# Altium schematic symbol library IC_TI.SCHLIB: 1162 symbols (part 2 of 8) (continued)
## LM337 (continued)
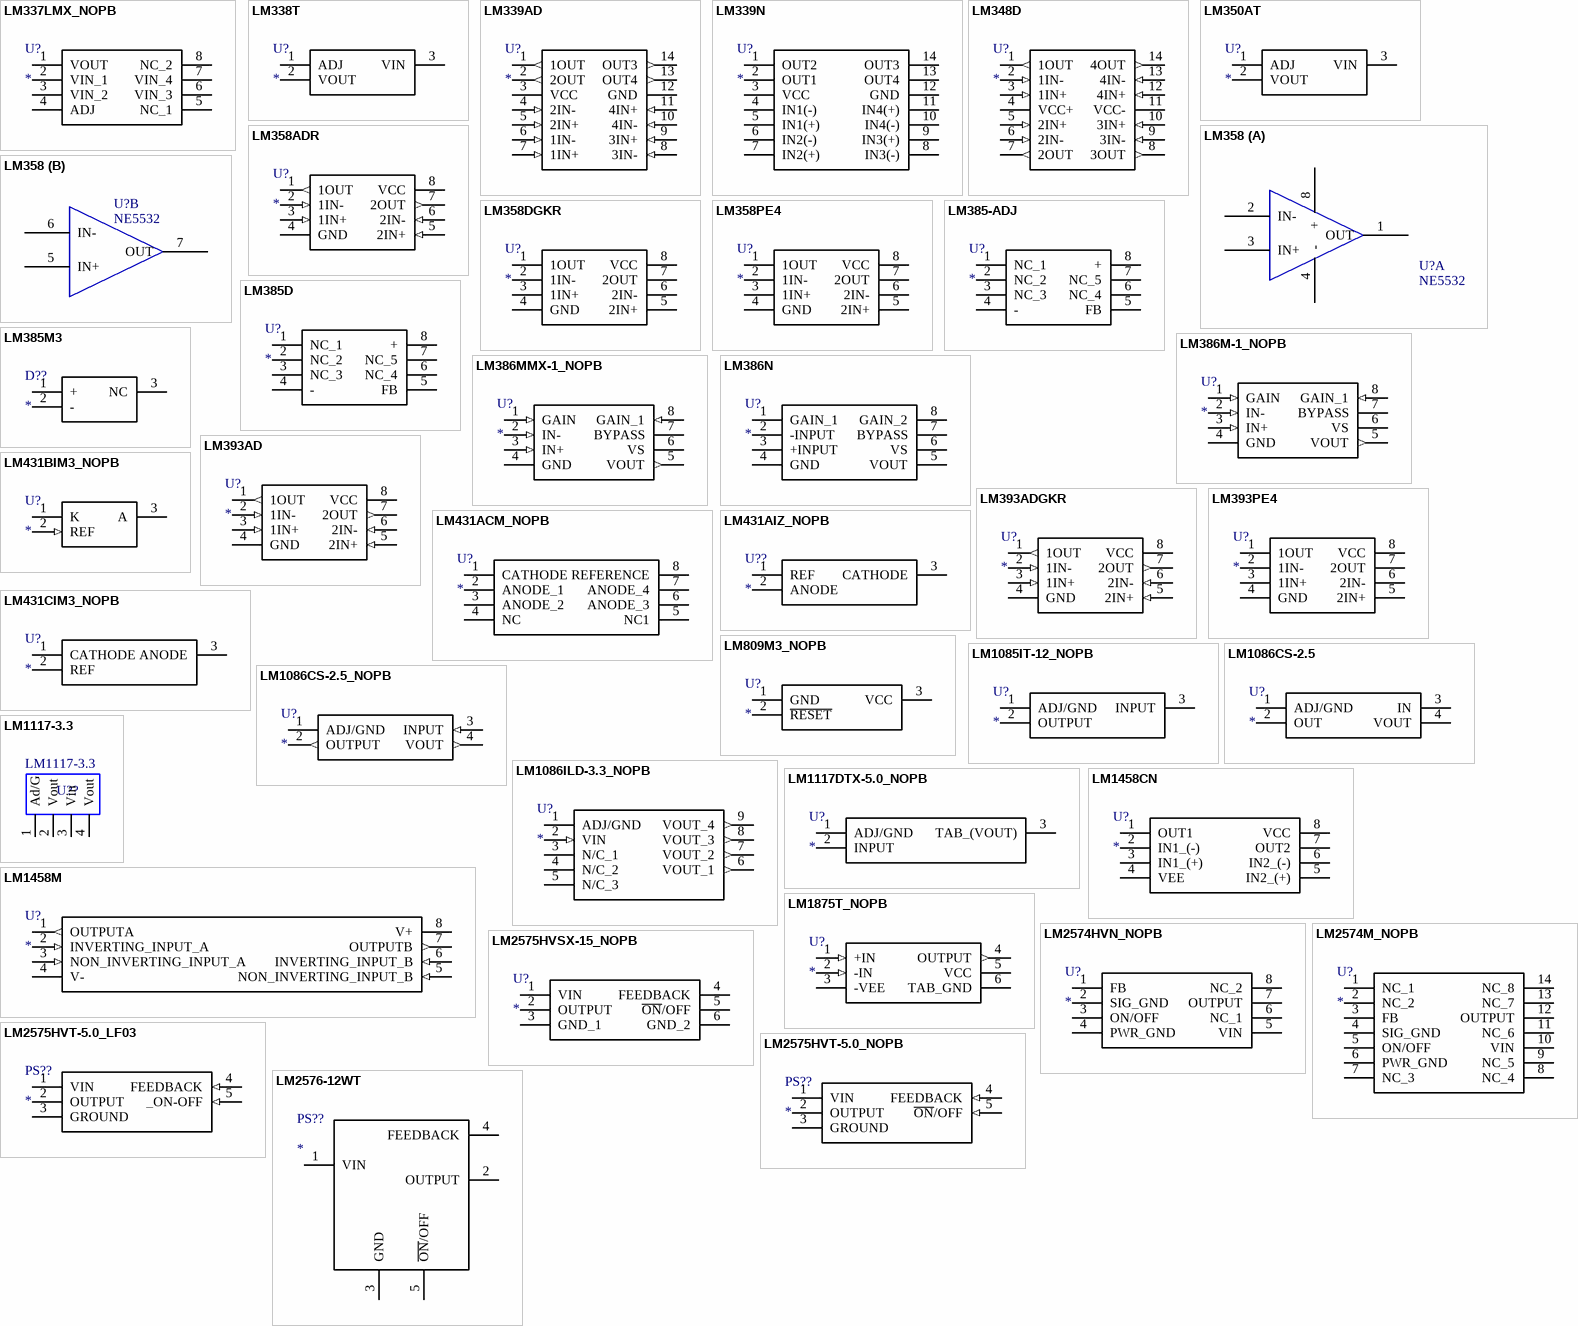
[diagram p8: symbols LM337LMX_NOPB to LM2576-12WT]

## LM337LMX_NOPB
designator U?
Integrated Circuit; Manufacturer_Name: Texas Instruments; Manufacturer_Part_Number: LM337LMX/NOPB; Datasheet Link: http://www.ti.com/lit/gpn/lm337l; Height: 1.75mm; Mouser Part Number: 926-LM337LMX/NOPB; Mouser Price/Stock: https://www.mouser.com/Search/Refine.aspx?Keyword=926-LM337LMX%2FNOPB
footprint SOIC8_1.27 (SOP, 8-Leads, Pitch 1.27mm)
pins: 1 VOUT, 2 VIN_1, 3 VIN_2, 4 ADJ, 5 NC_1, 6 VIN_3, 7 VIN_4, 8 NC_2

## LM338T
designator U?
Integrated Circuit; Manufacturer_Name: Texas Instruments; Manufacturer_Part_Number: LM338T; Datasheet Link: http://www.ti.com/lit/ds/symlink/lm338.pdf; Height: 4.7mm; Mouser Part Number: 926-LM338T; Mouser Price/Stock: https://www.mouser.com/Search/Refine.aspx?Keyword=926-LM338T; RS Part Number: 2508260761; RS Price/Stock: http://uk.rs-online.com/web/p/products/2508260761
footprint TO220-3
pins: 1 ADJ, 2 VOUT, 3 VIN

## LM339AD
designator U?
Integrated Circuit; Manufacturer_Name: Texas Instruments; Manufacturer_Part_Number: LM339AD; Datasheet Link: http://www.ti.com/lit/ds/symlink/lm339a.pdf; Height: 1.75mm; Mouser Part Number: 595-LM339AD; Mouser Price/Stock: https://www.mouser.com/Search/Refine.aspx?Keyword=595-LM339AD; RS Part Number: 1449913; RS Price/Stock: http://uk.rs-online.com/web/p/products/1449913
footprint SOIC14_1.27
pins: 1 1OUT (out), 2 2OUT (out), 3 VCC (power), 4 2IN- (in), 5 2IN+ (in), 6 1IN- (in), 7 1IN+ (in), 8 3IN- (in), 9 3IN+ (in), 10 4IN- (in), 11 4IN+ (in), 12 GND (power), 13 OUT4 (out), 14 OUT3 (out)

## LM339N
designator U?
Integrated Circuit; Manufacturer_Name: Fairchild Semiconductor; Manufacturer_Part_Number: LM339N; Datasheet Link: https://www.fairchildsemi.com/datasheets/LM/LM239A.pdf; Height: 3.65mm; Mouser Part Number: 512-LM339N; Mouser Price/Stock: https://www.mouser.com/Search/Refine.aspx?Keyword=512-LM339N; RS Part Number: 2679872; RS Price/Stock: http://uk.rs-online.com/web/p/products/2679872
footprint DIP14
pins: 1 OUT2, 2 OUT1, 3 VCC, 4 IN1(-), 5 IN1(+), 6 IN2(-), 7 IN2(+), 8 IN3(-), 9 IN3(+), 10 IN4(-), 11 IN4(+), 12 GND, 13 OUT4, 14 OUT3

## LM348D
designator U?
Integrated Circuit; Manufacturer_Name: Texas Instruments; Manufacturer_Part_Number: LM348D; Datasheet Link: http://www.ti.com/lit/ds/symlink/lm348.pdf; Height: 1.75mm; Mouser Part Number: 595-LM348D; Mouser Price/Stock: https://www.mouser.com/Search/Refine.aspx?Keyword=595-LM348D; RS Part Number: 5172251; RS Price/Stock: http://uk.rs-online.com/web/p/products/5172251
footprint SOIC14_1.27
pins: 1 1OUT (out), 2 1IN- (in), 3 1IN+ (in), 4 VCC+ (power), 5 2IN+ (in), 6 2IN- (in), 7 2OUT (out), 8 3OUT (out), 9 3IN- (in), 10 3IN+ (in), 11 VCC- (power), 12 4IN+ (in), 13 4IN- (in), 14 4OUT (out)

## LM350AT
designator U?
Integrated Circuit; Manufacturer_Name: Texas Instruments; Manufacturer_Part_Number: LM350AT; Datasheet Link: https://www.jameco.com/Jameco/Products/ProdDS/838946.pdf; Height: 4.7mm; Mouser Part Number: 926-LM350AT; Mouser Price/Stock: https://www.mouser.com/Search/Refine.aspx?Keyword=926-LM350AT; RS Part Number: 4713974; RS Price/Stock: http://uk.rs-online.com/web/p/products/4713974
footprint TO220-3
pins: 1 ADJ, 2 VOUT, 3 VIN

## LM358
designator U?, comment NE5532
footprint SOIC8_1.27 (SOP, 8-Leads, Pitch 1.27mm)
part A pins: 1 OUT, 2 IN-, 3 IN+, 4 -, 8 +
part B pins: 5 IN+, 6 IN-, 7 OUT

## LM358ADR
designator U?
Integrated Circuit; Manufacturer_Name: Texas Instruments; Manufacturer_Part_Number: LM358ADR; Datasheet Link: http://www.ti.com/lit/ds/symlink/lm358a.pdf; Height: 1.75mm; Mouser Part Number: 595-LM358ADR; Mouser Price/Stock: https://www.mouser.com/Search/Refine.aspx?Keyword=595-LM358ADR; RS Part Number: 1788886; RS Price/Stock: http://uk.rs-online.com/web/p/products/1788886
footprint SOIC8_1.27 (SOP, 8-Leads, Pitch 1.27mm)
pins: 1 1OUT (out), 2 1IN- (in), 3 1IN+ (in), 4 GND (power), 5 2IN+ (in), 6 2IN- (in), 7 2OUT (out), 8 VCC (power)

## LM358DGKR
designator U?
Integrated Circuit; Manufacturer_Name: Texas Instruments; Manufacturer_Part_Number: LM358DGKR; Datasheet Link: http://www.ti.com/lit/gpn/lm358; Height: 1.1mm; Mouser Part Number: 595-LM358DGKR; Mouser Price/Stock: https://www.mouser.com/Search/Refine.aspx?Keyword=595-LM358DGKR; RS Part Number: 1625387; RS Price/Stock: http://uk.rs-online.com/web/p/products/1625387
footprint VSSOP8_0.65-PAD
pins: 1 1OUT, 2 1IN-, 3 1IN+, 4 GND, 5 2IN+, 6 2IN-, 7 2OUT, 8 VCC

## LM358PE4
designator U?
Integrated Circuit; Manufacturer_Name: Texas Instruments; Manufacturer_Part_Number: LM358PE4; Datasheet Link: http://www.ti.com/lit/ds/symlink/lm358.pdf; Height: 5.08mm; Mouser Part Number: 595-LM358PE4; Mouser Price/Stock: https://www.mouser.com/Search/Refine.aspx?Keyword=595-LM358PE4
footprint DIP8-A
pins: 1 1OUT, 2 1IN-, 3 1IN+, 4 GND, 5 2IN+, 6 2IN-, 7 2OUT, 8 VCC

## LM385-ADJ
designator U?
Integrated Circuit; Manufacturer_Name: Texas Instruments; Manufacturer_Part_Number: LM385-ADJ; Datasheet Link: http://www.ti.com/lit/ds/symlink/lm385-adj.pdf; Height: 1.75mm
footprint SOIC8_1.27 (SOP, 8-Leads, Pitch 1.27mm)
pins: 1 NC_1, 2 NC_2, 3 NC_3, 4 -, 5 FB, 6 NC_4, 7 NC_5, 8 +

## LM385D
designator U?
Integrated Circuit; Manufacturer_Name: Texas Instruments; Manufacturer_Part_Number: LM385-ADJ; Datasheet Link: http://www.ti.com/lit/ds/symlink/lm385-adj.pdf; Height: 1.75mm
footprint SOIC8_1.27 (SOP, 8-Leads, Pitch 1.27mm)
pins: 1 NC_1, 2 NC_2, 3 NC_3, 4 -, 5 FB, 6 NC_4, 7 NC_5, 8 +

## LM385M3
designator D??
Diode; Manufacturer_Name: Texas Instruments; Manufacturer_Part_Number: LM385M3-1.2; Datasheet Link: http://www.ti.com/lit/ds/symlink/lm385-1.2-n.pdf; Height: 0.95mm; Mouser Part Number: 926-LM385M3-12; Mouser Price/Stock: https://www.mouser.com/Search/Refine.aspx?Keyword=926-LM385M3-12; RS Part Number: 2508261562; RS Price/Stock: http://uk.rs-online.com/web/p/products/2508261562
footprint SOT23-3 (贴片MOS的SOT-23封装)
pins: 1 +, 2 -, 3 NC

## LM386M-1_NOPB
designator U?
Integrated Circuit; Manufacturer_Name: Texas Instruments; Manufacturer_Part_Number: LM386M-1/NOPB; Datasheet Link: http://docs-emea.rs-online.com/webdocs/06e8/0900766b806e88be.pdf; Height: 1.753mm; Mouser Part Number: 926-LM386M-1/NOPB; Mouser Price/Stock: https://www.mouser.com/Search/Refine.aspx?Keyword=926-LM386M-1%2FNOPB; RS Part Number: 5361366P; RS Price/Stock: http://uk.rs-online.com/web/p/products/5361366P
footprint SOIC8_1.27 (SOP, 8-Leads, Pitch 1.27mm)
pins: 1 GAIN (in), 2 IN- (in), 3 IN+ (in), 4 GND (power), 5 VOUT (out), 6 VS, 7 BYPASS, 8 GAIN_1 (in)

## LM386MMX-1_NOPB
designator U?
Integrated Circuit; Manufacturer_Name: Texas Instruments; Manufacturer_Part_Number: LM386MMX-1/NOPB; Datasheet Link: http://www.ti.com/lit/gpn/lm386; Height: 1.1mm; Mouser Part Number: 926-LM386MMX-1/NOPB; Mouser Price/Stock: https://www.mouser.com/Search/Refine.aspx?Keyword=926-LM386MMX-1%2FNOPB
footprint VSSOP8_0.65-PAD
pins: 1 GAIN (in), 2 IN- (in), 3 IN+ (in), 4 GND (power), 5 VOUT (out), 6 VS, 7 BYPASS, 8 GAIN_1 (in)

## LM386N
designator U?
Integrated Circuit; Manufacturer_Name: Texas Instruments; Manufacturer_Part_Number: LM386N; Datasheet Link: http://www.ti.com/lit/ds/symlink/lm386.pdf; Height: 5.08mm; Mouser Part Number: 595-LM386N; Mouser Price/Stock: https://www.mouser.com/Search/Refine.aspx?Keyword=595-LM386N
footprint DIP8-A
pins: 1 GAIN_1, 2 -INPUT, 3 +INPUT, 4 GND, 5 VOUT, 6 VS, 7 BYPASS, 8 GAIN_2

## LM393AD
designator U?
Integrated Circuit; Manufacturer_Name: Texas Instruments; Manufacturer_Part_Number: LM393AD; Datasheet Link: http://www.ti.com/lit/ds/symlink/lm393a.pdf; Height: 1.75mm; Mouser Part Number: 595-LM393AD; Mouser Price/Stock: https://www.mouser.com/Search/Refine.aspx?Keyword=595-LM393AD; RS Part Number: 1791746; RS Price/Stock: http://uk.rs-online.com/web/p/products/1791746
footprint SOIC8_1.27 (SOP, 8-Leads, Pitch 1.27mm)
pins: 1 1OUT (out), 2 1IN- (in), 3 1IN+ (in), 4 GND (power), 5 2IN+ (in), 6 2IN- (in), 7 2OUT (out), 8 VCC (power)

## LM393ADGKR
designator U?
Integrated Circuit; Manufacturer_Name: Texas Instruments; Manufacturer_Part_Number: LM393ADGKR; Datasheet Link: http://www.ti.com/lit/ds/symlink/lm393a.pdf; Height: 1.1mm; Mouser Part Number: 595-LM393ADGKR; Mouser Price/Stock: https://www.mouser.com/Search/Refine.aspx?Keyword=595-LM393ADGKR; RS Part Number: 1626568; RS Price/Stock: http://uk.rs-online.com/web/p/products/1626568
footprint VSSOP8_0.65-PAD
pins: 1 1OUT (out), 2 1IN- (in), 3 1IN+ (in), 4 GND (power), 5 2IN+ (in), 6 2IN- (in), 7 2OUT (out), 8 VCC (power)

## LM393PE4
designator U?
Integrated Circuit; Manufacturer_Name: Texas Instruments; Manufacturer_Part_Number: LM393PE4; Datasheet Link: http://www.ti.com/lit/ds/symlink/lm393.pdf; Height: 5.08mm; Mouser Part Number: 595-LM393PE4; Mouser Price/Stock: https://www.mouser.com/Search/Refine.aspx?Keyword=595-LM393PE4
footprint DIP8-A
pins: 1 1OUT, 2 1IN-, 3 1IN+, 4 GND, 5 2IN+, 6 2IN-, 7 2OUT, 8 VCC

## LM431ACM_NOPB
designator U?
Integrated Circuit; Manufacturer_Name: Texas Instruments; Manufacturer_Part_Number: LM431ACM/NOPB; Datasheet Link: http://www.ti.com/lit/ds/symlink/lm431.pdf; Height: 1.75mm; Mouser Part Number: 926-LM431ACM/NOPB; Mouser Price/Stock: https://www.mouser.com/Search/Refine.aspx?Keyword=926-LM431ACM%2FNOPB; RS Part Number: 1788847; RS Price/Stock: http://uk.rs-online.com/web/p/products/1788847
footprint SOIC8_1.27 (SOP, 8-Leads, Pitch 1.27mm)
pins: 1 CATHODE, 2 ANODE_1, 3 ANODE_2, 4 NC, 5 NC1, 6 ANODE_3, 7 ANODE_4, 8 REFERENCE

## LM431AIZ_NOPB
designator U??
Undefined or Miscellaneous; Manufacturer_Name: Texas Instruments; Manufacturer_Part_Number: LM431AIZ/NOPB; Datasheet Link: http://www.ti.com/lit/gpn/lm431; Mouser Part Number: 926-LM431AIZ/NOPB; Mouser Price/Stock: https://www.mouser.com/Search/Refine.aspx?Keyword=926-LM431AIZ%2FNOPB; RS Part Number: 1626257; RS Price/Stock: http://uk.rs-online.com/web/p/products/1626257
footprint TO92
pins: 1 REF, 2 ANODE, 3 CATHODE

## LM431BIM3_NOPB
designator U?
Integrated Circuit; Manufacturer_Name: Texas Instruments; Manufacturer_Part_Number: LM431BIM3/NOPB; Datasheet Link: http://www.ti.com/lit/ds/symlink/lm431.pdf; Height: 1.12mm; Mouser Part Number: 926-LM431BIM3/NOPB; Mouser Price/Stock: https://www.mouser.com/Search/Refine.aspx?Keyword=926-LM431BIM3%2FNOPB; RS Part Number: 5359751P; RS Price/Stock: http://befr.rs-online.com/web/p/products/5359751P
footprint SOT23-3 (贴片MOS的SOT-23封装)
pins: 1 K, 2 REF (in), 3 A

## LM431CIM3_NOPB
designator U?
Integrated Circuit; Manufacturer_Name: Texas Instruments; Manufacturer_Part_Number: LM431CIM3/NOPB; Datasheet Link: http://www.farnell.com/datasheets/1972837.pdf; Height: 1.12mm; Mouser Part Number: 926-LM431CIM3/NOPB; Mouser Price/Stock: https://www.mouser.com/Search/Refine.aspx?Keyword=926-LM431CIM3%2FNOPB; RS Part Number: 7615949P; RS Price/Stock: http://uk.rs-online.com/web/p/products/7615949P
footprint SOT23-3 (贴片MOS的SOT-23封装)
pins: 1 CATHODE, 2 REF, 3 ANODE

## LM809M3_NOPB
designator U?
Integrated Circuit; Manufacturer_Name: Texas Instruments; Manufacturer_Part_Number: LM809M3-4.38/NOPB; Datasheet Link: http://www.ti.com/lit/gpn/lm809; Height: 0.95mm; Mouser Part Number: 595-LM809M3-4.3/NPB; Mouser Price/Stock: https://www.mouser.com/Search/Refine.aspx?Keyword=595-LM809M3-4.3%2FNPB
footprint SOT23-3 (贴片MOS的SOT-23封装)
pins: 1 GND, 2 ~{RESET}, 3 VCC

## LM1085IT-12_NOPB
designator U?
Integrated Circuit; Manufacturer_Name: Texas Instruments; Manufacturer_Part_Number: LM1085IT-12/NOPB; Datasheet Link: http://www.ti.com/lit/gpn/lm1085; Height: 4.7mm; Mouser Part Number: 926-LM1085IT-12/NOPB; Mouser Price/Stock: https://www.mouser.com/Search/Refine.aspx?Keyword=926-LM1085IT-12%2FNOPB; RS Part Number: 5339381P; RS Price/Stock: http://uk.rs-online.com/web/p/products/5339381P
footprint TO220-3
pins: 1 ADJ/GND, 2 OUTPUT, 3 INPUT

## LM1086CS-2.5
designator U?
Integrated Circuit; Manufacturer_Name: Texas Instruments; Manufacturer_Part_Number: LM1086CS-2.5; RS Part Number: 4717471; RS Price/Stock: http://uk.rs-online.com/web/p/products/4717471
footprint TO263-3
pins: 1 ADJ/GND, 2 OUT, 3 IN, 4 VOUT

## LM1086CS-2.5_NOPB
designator U?
Integrated Circuit; Manufacturer_Name: Texas Instruments; Manufacturer_Part_Number: LM1086CS-2.5/NOPB; Datasheet Link: http://www.ti.com/lit/ds/symlink/lm1086.pdf; Height: 4.64mm; Mouser Part Number: 926-LM1086CS25NOPB; Mouser Price/Stock: https://www.mouser.com/Search/Refine.aspx?Keyword=926-LM1086CS25NOPB; RS Part Number: 1789246; RS Price/Stock: http://uk.rs-online.com/web/p/products/1789246
footprint TO263-3
pins: 1 ADJ/GND (power), 2 OUTPUT (out), 3 INPUT (in), 4 VOUT (out)

## LM1086ILD-3.3_NOPB
designator U?
Integrated Circuit; Manufacturer_Name: Texas Instruments; Manufacturer_Part_Number: LM1086ILD-3.3/NOPB; Datasheet Link: http://www.ti.com/lit/ds/symlink/lm1086.pdf; Height: 0.8mm; Mouser Part Number: 926-LM1086ILD33NOPB; Mouser Price/Stock: https://www.mouser.com/Search/Refine.aspx?Keyword=926-LM1086ILD33NOPB
footprint DFN8_0.8-PAD(4X4) (DFN8_0.5-PAD(3X3))
pins: 1 ADJ/GND (power), 2 VIN (in), 3 N/C_1, 4 N/C_2, 5 N/C_3, 6 VOUT_1 (out), 7 VOUT_2 (out), 8 VOUT_3 (out), 9 VOUT_4 (out)

## LM1117-3.3
designator U??, comment Sch Name: LM1117-3.3  (hidden comment: Device Name)
3.3V稳压芯片1117; Manufacture: Device Name
footprint SOT223
pins: 1 Ad/G, 2 Vout, 3 Vin, 4 Vout

## LM1117DTX-5.0_NOPB
designator U?
Integrated Circuit; Manufacturer_Name: Texas Instruments; Manufacturer_Part_Number: LM1117DTX-5.0/NOPB; Datasheet Link: http://www.ti.com/lit/gpn/lm1117; Mouser Part Number: 926-LM1117DTX50NOPB; Mouser Price/Stock: https://www.mouser.com/Search/Refine.aspx?Keyword=926-LM1117DTX50NOPB
footprint TO252
pins: 1 ADJ/GND, 2 INPUT, 3 TAB_(VOUT)

## LM1458CN
designator U?
Integrated Circuit; Manufacturer_Name: Fairchild Semiconductor; Manufacturer_Part_Number: LM1458CN; Datasheet Link: https://componentsearchengine.com/Datasheets/1/LM1458CN.pdf; Height: 5.08mm; Mouser Part Number: 512-LM1458CN; Mouser Price/Stock: https://www.mouser.com/Search/Refine.aspx?Keyword=512-LM1458CN
footprint DIP8
pins: 1 OUT1, 2 IN1_(-), 3 IN1_(+), 4 VEE, 5 IN2_(+), 6 IN2_(-), 7 OUT2, 8 VCC

## LM1458M
designator U?
Integrated Circuit; Manufacturer_Name: Texas Instruments; Manufacturer_Part_Number: LM1458M; Datasheet Link: http://www.ti.com/lit/ds/symlink/lm1458.pdf; Height: 1.75mm; Mouser Part Number: 926-LM1458M; Mouser Price/Stock: https://www.mouser.com/Search/Refine.aspx?Keyword=926-LM1458M; RS Part Number: 4716175; RS Price/Stock: http://uk.rs-online.com/web/p/products/4716175
footprint SOIC8_1.27 (SOP, 8-Leads, Pitch 1.27mm)
pins: 1 OUTPUTA (out), 2 INVERTING_INPUT_A (in), 3 NON_INVERTING_INPUT_A (in), 4 V-, 5 NON_INVERTING_INPUT_B (in), 6 INVERTING_INPUT_B (in), 7 OUTPUTB (out), 8 V+

## LM1875T_NOPB
designator U?
Integrated Circuit; Manufacturer_Name: Texas Instruments; Manufacturer_Part_Number: LM1875T/NOPB; Datasheet Link: http://www.ti.com/lit/ds/symlink/lm1875.pdf; Mouser Part Number: 926-LM1875T/NOPB; Mouser Price/Stock: https://www.mouser.com/Search/Refine.aspx?Keyword=926-LM1875T%2FNOPB; RS Part Number: 5358736P; RS Price/Stock: http://uk.rs-online.com/web/p/products/5358736P
footprint TO220-5
pins: 1 +IN (in), 2 -IN (in), 3 -VEE, 4 OUTPUT (out), 5 VCC (power), 6 TAB_GND (power)

## LM2574HVN_NOPB
designator U?
Integrated Circuit; Manufacturer_Name: Texas Instruments; Manufacturer_Part_Number: LM2574HVN-12/NOPB; Datasheet Link: http://www.ti.com/lit/gpn/lm2574hv; Height: 5.08mm; Mouser Part Number: 926-LM2574HVN12NOPB; Mouser Price/Stock: https://www.mouser.com/Search/Refine.aspx?Keyword=926-LM2574HVN12NOPB; RS Part Number: 1626563; RS Price/Stock: http://uk.rs-online.com/web/p/products/1626563
footprint DIP8-A
pins: 1 FB, 2 SIG_GND, 3 ON/OFF, 4 PWR_GND, 5 VIN, 6 NC_1, 7 OUTPUT, 8 NC_2

## LM2574M_NOPB
designator U?
Integrated Circuit; Manufacturer_Name: Texas Instruments; Manufacturer_Part_Number: LM2574M-3.3/NOPB; Datasheet Link: http://www.ti.com/lit/gpn/lm2574; Height: 2.642mm; Mouser Part Number: 926-LM2574M-3.3/NOPB; Mouser Price/Stock: https://www.mouser.com/Search/Refine.aspx?Keyword=926-LM2574M-3.3%2FNOPB; RS Part Number: 7615491P; RS Price/Stock: http://uk.rs-online.com/web/p/products/7615491P
footprint SOIC14W_1.27
pins: 1 NC_1, 2 NC_2, 3 FB, 4 SIG_GND, 5 ON/OFF, 6 PWR_GND, 7 NC_3, 8 NC_4, 9 NC_5, 10 VIN, 11 NC_6, 12 OUTPUT, 13 NC_7, 14 NC_8

## LM2575HVSX-15_NOPB
designator U?
Integrated Circuit; Manufacturer_Name: Texas Instruments; Manufacturer_Part_Number: LM2575HVSX-15/NOPB; Datasheet Link: http://www.ti.com/lit/ds/symlink/lm2575-n.pdf; Mouser Part Number: 926-LM2575HVSX15NOPB; Mouser Price/Stock: https://www.mouser.com/Search/Refine.aspx?Keyword=926-LM2575HVSX15NOPB
footprint TO263-5
pins: 1 VIN, 2 OUTPUT, 3 GND_1, 4 FEEDBACK, 5 ~{ON}/OFF, 6 GND_2

## LM2575HVT-5.0_LF03
designator PS??
Power Supply; Manufacturer_Name: Texas Instruments; Manufacturer_Part_Number: LM2575HVT-5.0/LF03; Datasheet Link: https://componentsearchengine.com/ga/detail.html?searchString=LM2575HVT-5.0%2FLF03&manuf=Texas%20Instruments&country=GB&language=en&source=63; Height: 4.7mm; Mouser Part Number: 926-LM2575HVT50LF03; Mouser Price/Stock: https://www.mouser.com/Search/Refine.aspx?Keyword=926-LM2575HVT50LF03
footprint TO220-5
pins: 1 VIN (power), 2 OUTPUT (power), 3 GROUND (power), 4 FEEDBACK (in), 5 _ON-OFF (in)

## LM2575HVT-5.0_NOPB
designator PS??
Power Supply; Manufacturer_Name: Texas Instruments; Manufacturer_Part_Number: LM2575HVT-5.0/NOPB; Datasheet Link: http://www.ti.com/lit/gpn/lm2575hv; Mouser Part Number: 926-LM2575HVT5.0NOPB; Mouser Price/Stock: https://www.mouser.com/Search/Refine.aspx?Keyword=926-LM2575HVT5.0NOPB; RS Part Number: 5338029P; RS Price/Stock: http://uk.rs-online.com/web/p/products/5338029P
footprint TO220-5A
pins: 1 VIN (power), 2 OUTPUT (power), 3 GROUND (power), 4 FEEDBACK (in), 5 ~{ON}/OFF (in)

## LM2576-12WT
designator PS??
Power Supply; Manufacturer_Name: Microchip; Manufacturer_Part_Number: LM2576-12WT; Datasheet Link: http://ww1.microchip.com/downloads/en/DeviceDoc/lm2576.pdf; Height: 4.7mm; Mouser Part Number: 998-LM2576-12WT; RS Part Number: 1771609; RS Price/Stock: http://uk.rs-online.com/web/p/products/1771609
footprint TO220-5A
pins: 1 VIN, 2 OUTPUT, 3 GND, 4 FEEDBACK, 5 ~{ON}/OFF

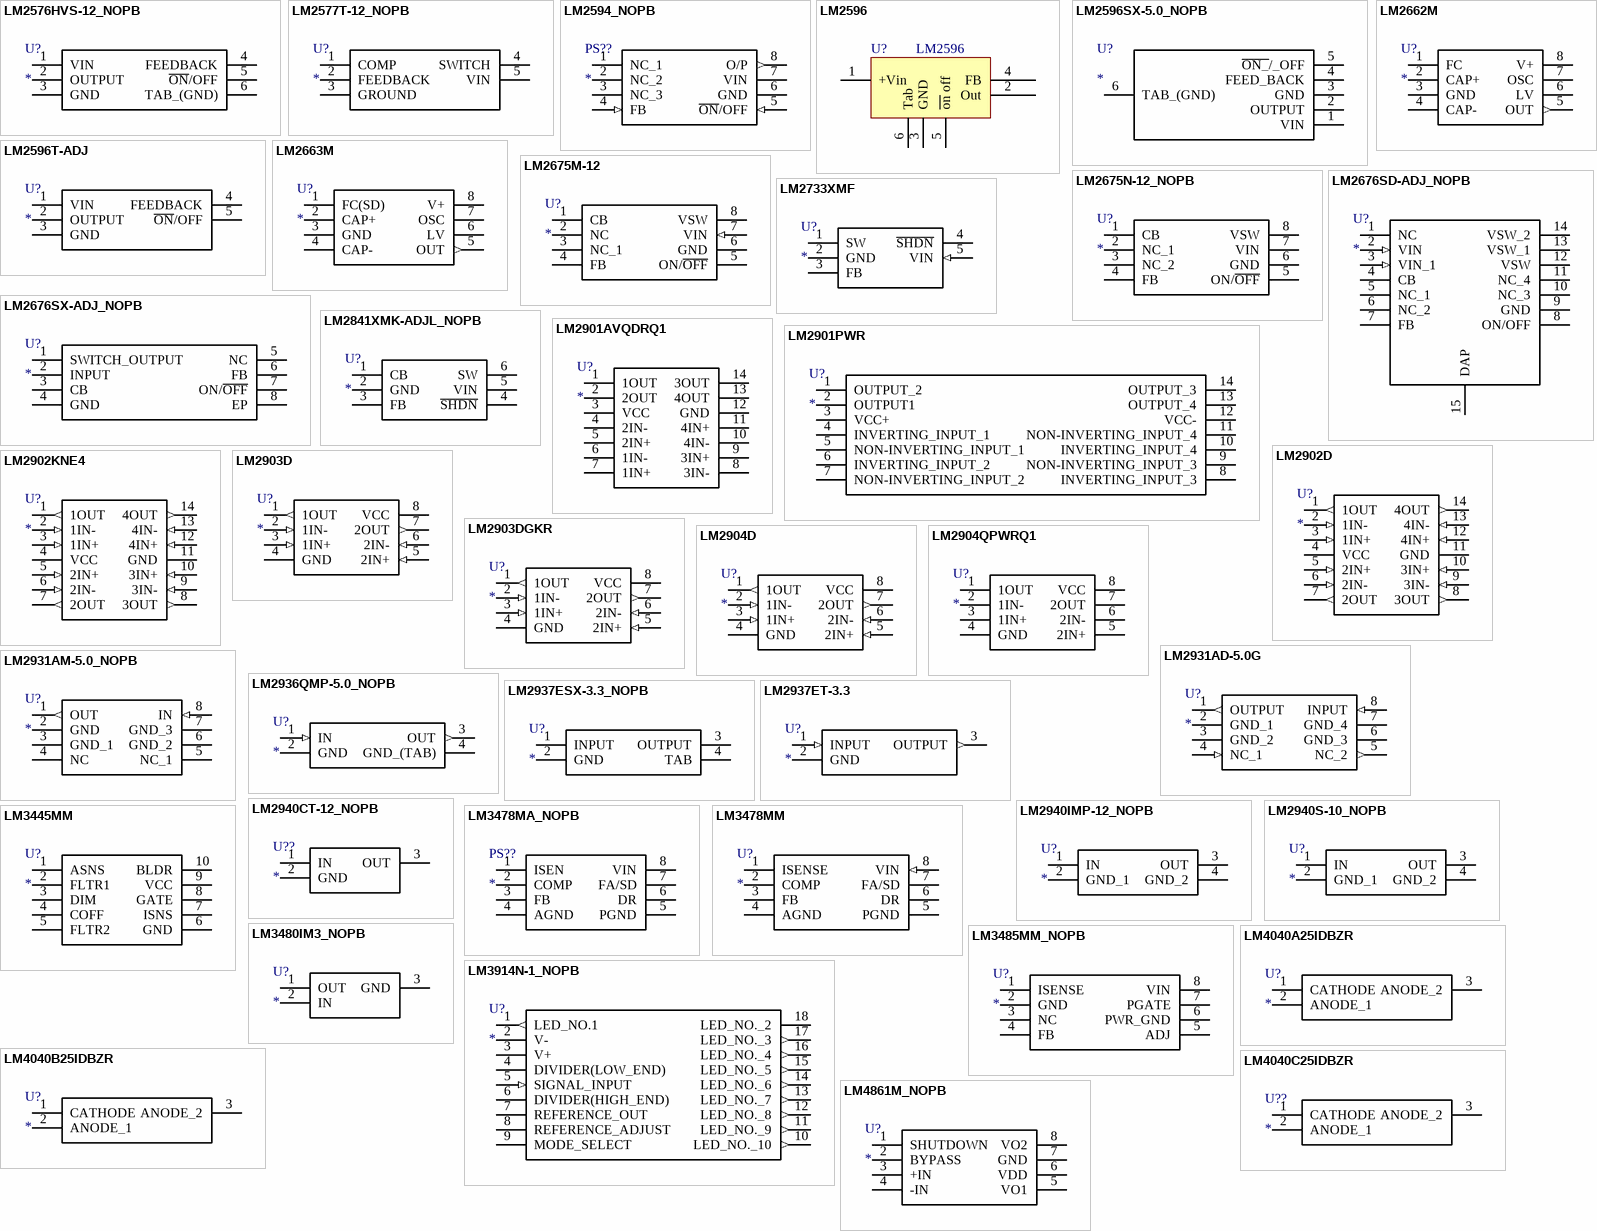
[diagram p9: symbols LM2576HVS-12_NOPB to LM4861M_NOPB]

## LM2576HVS-12_NOPB
designator U?
Integrated Circuit; Manufacturer_Name: Texas Instruments; Manufacturer_Part_Number: LM2576HVS-12/NOPB; Datasheet Link: http://www.ti.com/lit/gpn/lm2576hv; Mouser Part Number: 926-LM2576HVS-12NOPB; Mouser Price/Stock: https://www.mouser.com/Search/Refine.aspx?Keyword=926-LM2576HVS-12NOPB
footprint TO263-5
pins: 1 VIN, 2 OUTPUT, 3 GND, 4 FEEDBACK, 5 ~{ON}/OFF, 6 TAB_(GND)

## LM2577T-12_NOPB
designator U?
Integrated Circuit; Manufacturer_Name: Texas Instruments; Manufacturer_Part_Number: LM2577T-12/NOPB; Datasheet Link: http://www.farnell.com/datasheets/2060343.pdf; Height: 4.83mm; Mouser Part Number: 926-LM2577T-12/NOPB; Mouser Price/Stock: https://www.mouser.com/Search/Refine.aspx?Keyword=926-LM2577T-12%2FNOPB; RS Part Number: 2509474205; RS Price/Stock: http://uk.rs-online.com/web/p/products/2509474205
footprint TO220-5B
pins: 1 COMP, 2 FEEDBACK, 3 GROUND, 4 SWITCH, 5 VIN

## LM2594_NOPB
designator PS??
Power Supply; Manufacturer_Name: Texas Instruments; Manufacturer_Part_Number: LM2594-5.0 MWA/NOPB; Datasheet Link: http://www.ti.com; Height: 1.75mm; Mouser Part Number: N/A; Mouser Price/Stock: https://www.mouser.com/Search/Refine.aspx?Keyword=N%2FA
footprint SOIC8_1.27 (SOP, 8-Leads, Pitch 1.27mm)
pins: 1 NC_1, 2 NC_2, 3 NC_3, 4 FB (in), 5 ~{ON}/OFF (in), 6 GND (power), 7 VIN (power), 8 O/P (out)

## LM2596
designator U?
footprint TO263-5
pins: 1 +Vin, 2 Out, 3 GND, 4 FB, 5 ~{on} off, 6 Tab

## LM2596SX-5.0_NOPB
designator U?
Integrated Circuit; Manufacturer_Name: Texas Instruments; Manufacturer_Part_Number: LM2596SX-5.0/NOPB; Datasheet Link: http://www.ti.com/lit/gpn/lm2596; Mouser Part Number: 926-LM2596SX-5.0NOPB; Mouser Price/Stock: https://www.mouser.com/Search/Refine.aspx?Keyword=926-LM2596SX-5.0NOPB
footprint TO263-5
pins: 1 VIN, 2 OUTPUT, 3 GND, 4 FEED_BACK, 5 ~{ON_}/_OFF, 6 TAB_(GND)

## LM2596T-ADJ
designator U?
Integrated Circuit; Manufacturer_Name: Texas Instruments; Manufacturer_Part_Number: LM2596T-ADJ; Datasheet Link: http://www.ti.com/lit/ds/symlink/lm2596.pdf; Height: 4.7mm; Mouser Part Number: 926-LM2596T-ADJ; Mouser Price/Stock: https://www.mouser.com/Search/Refine.aspx?Keyword=926-LM2596T-ADJ; RS Part Number: 3313258; RS Price/Stock: http://uk.rs-online.com/web/p/products/3313258
footprint TO220-5
pins: 1 VIN, 2 OUTPUT, 3 GND, 4 FEEDBACK, 5 ~{ON}/OFF

## LM2662M
designator U?
Integrated Circuit; Manufacturer_Name: Texas Instruments; Manufacturer_Part_Number: LM2662M; Datasheet Link: http://www.ti.com/lit/ds/symlink/lm2662.pdf; Height: 1.75mm; Mouser Part Number: 926-LM2662M; Mouser Price/Stock: https://www.mouser.com/Search/Refine.aspx?Keyword=926-LM2662M; RS Part Number: 4699272; RS Price/Stock: http://uk.rs-online.com/web/p/products/4699272
footprint SOIC8_1.27 (SOP, 8-Leads, Pitch 1.27mm)
pins: 1 FC, 2 CAP+, 3 GND (power), 4 CAP-, 5 OUT (out), 6 LV, 7 OSC, 8 V+

## LM2663M
designator U?
Integrated Circuit; Manufacturer_Name: Texas Instruments; Manufacturer_Part_Number: LM2663M; Datasheet Link: http://www.ti.com/lit/ds/symlink/lm2663.pdf; Height: 1.75mm; Mouser Part Number: 926-LM2663M; Mouser Price/Stock: https://www.mouser.com/Search/Refine.aspx?Keyword=926-LM2663M; RS Part Number: 3492648
footprint SOIC8_1.27 (SOP, 8-Leads, Pitch 1.27mm)
pins: 1 FC(SD), 2 CAP+, 3 GND (power), 4 CAP-, 5 OUT (out), 6 LV, 7 OSC, 8 V+

## LM2675M-12
designator U?
Integrated Circuit; Manufacturer_Name: Texas Instruments; Manufacturer_Part_Number: LM2675M-12; Datasheet Link: http://www.ti.com/lit/ds/symlink/lm2675.pdf; Height: 1.75mm; Mouser Part Number: 926-LM2675M-12; Mouser Price/Stock: https://www.mouser.com/Search/Refine.aspx?Keyword=926-LM2675M-12; RS Part Number: 4699452; RS Price/Stock: http://uk.rs-online.com/web/p/products/4699452
footprint SOIC8_1.27 (SOP, 8-Leads, Pitch 1.27mm)
pins: 1 CB, 2 NC, 3 NC_1, 4 FB, 5 ON/~{OFF}, 6 GND (power), 7 VIN (in), 8 VSW

## LM2675N-12_NOPB
designator U?
Integrated Circuit; Manufacturer_Name: Texas Instruments; Manufacturer_Part_Number: LM2675N-12/NOPB; Datasheet Link: http://www.ti.com/lit/gpn/lm2675; Height: 5.08mm; Mouser Part Number: 926-LM2675N-12/NOPB; Mouser Price/Stock: https://www.mouser.com/Search/Refine.aspx?Keyword=926-LM2675N-12%2FNOPB; RS Part Number: 5335064P; RS Price/Stock: http://uk.rs-online.com/web/p/products/5335064P
footprint DIP8-A
pins: 1 CB, 2 NC_1, 3 NC_2, 4 FB, 5 ON/~{OFF}, 6 GND, 7 VIN, 8 VSW

## LM2676SD-ADJ_NOPB
designator U?
Integrated Circuit; Manufacturer_Name: Texas Instruments; Manufacturer_Part_Number: LM2676SD-ADJ/NOPB; Datasheet Link: http://www.ti.com/lit/ds/symlink/lm2676.pdf; Height: 1mm; Mouser Part Number: 926-LM2676SDADJNOPB; Mouser Price/Stock: https://www.mouser.com/Search/Refine.aspx?Keyword=926-LM2676SDADJNOPB; RS Part Number: 168765; RS Price/Stock: http://uk.rs-online.com/web/p/buck-converters/168765/?source=DS
footprint DFN14_0.8-PAD(5X6)
pins: 1 NC, 2 VIN (in), 3 VIN_1 (in), 4 CB, 5 NC_1, 6 NC_2, 7 FB, 8 ON/OFF, 9 GND (power), 10 NC_3, 11 NC_4, 12 VSW, 13 VSW_1, 14 VSW_2, 15 DAP

## LM2676SX-ADJ_NOPB
designator U?
Integrated Circuit; Manufacturer_Name: Texas Instruments; Manufacturer_Part_Number: LM2676SX-ADJ/NOPB; Datasheet Link: http://www.ti.com/lit/gpn/lm2676; Mouser Part Number: 926-LM2676SX-ADJNOPB; Mouser Price/Stock: https://www.mouser.com/Search/Refine.aspx?Keyword=926-LM2676SX-ADJNOPB
footprint TO263-7A
pins: 1 SWITCH_OUTPUT, 2 INPUT, 3 CB, 4 GND, 5 NC, 6 FB, 7 ON/~{OFF}, 8 EP

## LM2733XMF
designator U?
Integrated Circuit; Manufacturer_Name: Texas Instruments; Manufacturer_Part_Number: LM2733XMF; Datasheet Link: http://www.ti.com/lit/ds/symlink/lm2733.pdf; Height: 1.45mm; Mouser Part Number: 926-LM2733XMF; Mouser Price/Stock: https://www.mouser.com/Search/Refine.aspx?Keyword=926-LM2733XMF; RS Part Number: 4699755; RS Price/Stock: http://uk.rs-online.com/web/p/products/4699755
footprint SOT23-5 (SOT23, 5-Leads, Body 3.0x3.0mm (max), Pitch 0.95mm, IPC Medium Density)
pins: 1 SW, 2 GND (power), 3 FB, 4 ~{SHDN}, 5 VIN (in)

## LM2841XMK-ADJL_NOPB
designator U?
Integrated Circuit; Manufacturer_Name: Texas Instruments; Manufacturer_Part_Number: LM2841XMK-ADJL/NOPB; Datasheet Link: http://www.ti.com/lit/ds/symlink/lm2841.pdf; Height: 1.1mm; Mouser Part Number: 926-M2841XMKADJLNOPB; Mouser Price/Stock: https://www.mouser.com/Search/Refine.aspx?Keyword=926-M2841XMKADJLNOPB; RS Part Number: 9216863; RS Price/Stock: http://uk.rs-online.com/web/p/products/9216863
footprint SOT23-6
pins: 1 CB, 2 GND, 3 FB, 4 ~{SHDN}, 5 VIN, 6 SW

## LM2901AVQDRQ1
designator U?
Integrated Circuit; Manufacturer_Name: Texas Instruments; Manufacturer_Part_Number: LM2901AVQDRQ1; Datasheet Link: http://www.ti.com/lit/gpn/lm2901av-q1; Height: 1.75mm; Mouser Part Number: 595-LM2901AVQDRQ1; Mouser Price/Stock: https://www.mouser.com/Search/Refine.aspx?Keyword=595-LM2901AVQDRQ1
footprint SOIC14_1.27
pins: 1 1OUT, 2 2OUT, 3 VCC, 4 2IN-, 5 2IN+, 6 1IN-, 7 1IN+, 8 3IN-, 9 3IN+, 10 4IN-, 11 4IN+, 12 GND, 13 4OUT, 14 3OUT

## LM2901PWR
designator U?
Integrated Circuit; Manufacturer_Name: ROHM Semiconductor; Manufacturer_Part_Number: LM2901PWR; Datasheet Link: https://componentsearchengine.com/Datasheets/1/LM2901PWR.pdf; Height: 1.2mm; Mouser Part Number: 755-LM2901PWR; Mouser Price/Stock: https://www.mouser.com/Search/Refine.aspx?Keyword=755-LM2901PWR
footprint SOIC14_1.27
pins: 1 OUTPUT_2, 2 OUTPUT1, 3 VCC+, 4 INVERTING_INPUT_1, 5 NON-INVERTING_INPUT_1, 6 INVERTING_INPUT_2, 7 NON-INVERTING_INPUT_2, 8 INVERTING_INPUT_3, 9 NON-INVERTING_INPUT_3, 10 INVERTING_INPUT_4, 11 NON-INVERTING_INPUT_4, 12 VCC-, 13 OUTPUT_4, 14 OUTPUT_3